# Altium footprint library IC_SMD_BGA.PCBLIB: 70 footprints (part 4 of 6)
Each footprint in its own frame and in the unit in brackets; x right, y up, seen from the top. Pads: shape width x height; smd on the part's side, far side on the other; paste and mask are expansions set on the pad; w line width, h text height; cw(c..) or ccw(c..) is an arc to the next point about the centre after c.
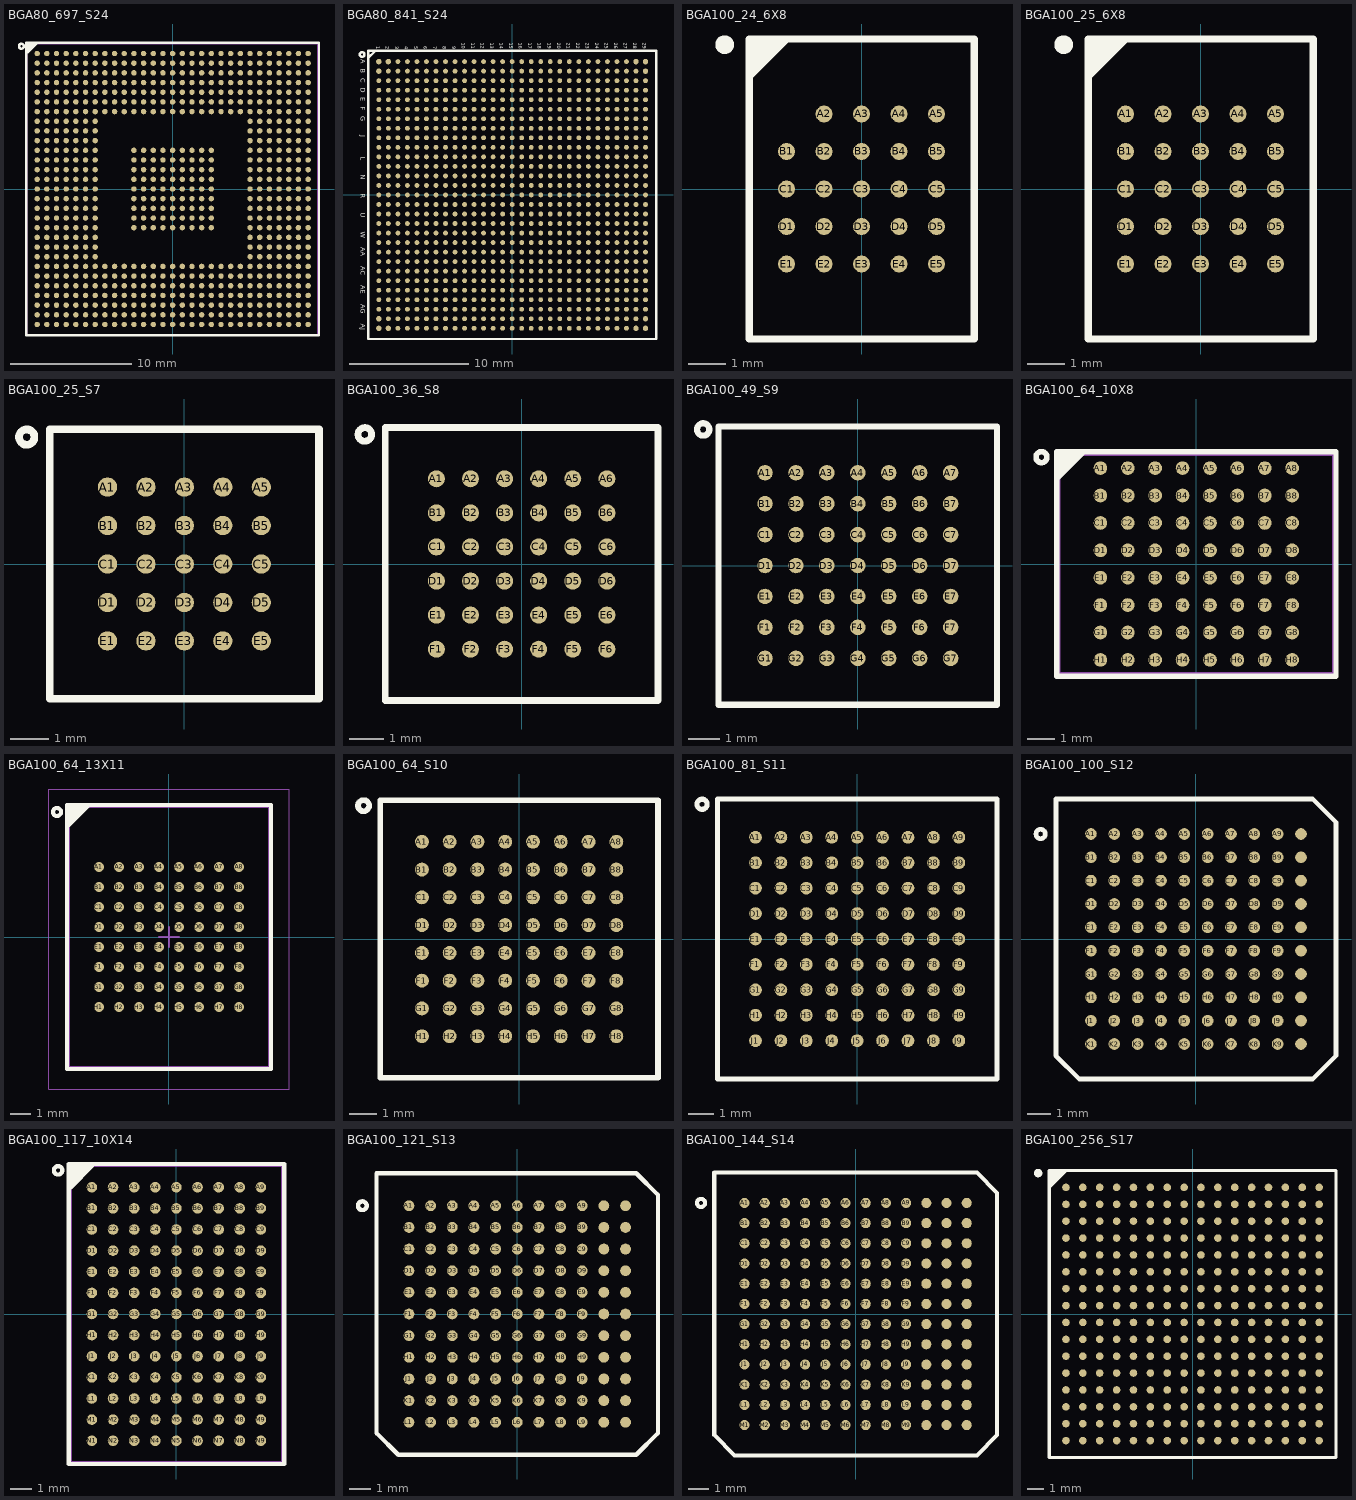
[diagram p3: the footprints below, top view; thin cyan lines are the x and y axes]

## BGA80_697_S24 [mm] "ZTZ GTZ PBGA N697"
height 3.2
pads (697):
  round 0.45 smd: A1(-11.2,11.2) A2(-10.4,11.2) A3(-9.6,11.2) A4(-8.8,11.2) A5(-8,11.2) A6(-7.2,11.2) A7(-6.4,11.2) A8(-5.6,11.2) A9(-4.8,11.2) A10(-4,11.2) A11(-3.2,11.2) A12(-2.4,11.2) A13(-1.6,11.2) A14(-0.8,11.2) A15(0,11.2) A16(0.8,11.2) A17(1.6,11.2) A18(2.4,11.2) A19(3.2,11.2) A20(4,11.2) A21(4.8,11.2) A22(5.6,11.2) A23(6.4,11.2) A24(7.2,11.2) A25(8,11.2) A26(8.8,11.2) A27(9.6,11.2) A28(10.4,11.2) A29(11.2,11.2) AA1(-11.2,-4.8) AA2(-10.4,-4.8) AA3(-9.6,-4.8) AA4(-8.8,-4.8) AA5(-8,-4.8) AA6(-7.2,-4.8) AA7(-6.4,-4.8) AA23(6.4,-4.8) AA24(7.2,-4.8) AA25(8,-4.8) AA26(8.8,-4.8) AA27(9.6,-4.8) AA28(10.4,-4.8) AA29(11.2,-4.8) AB1(-11.2,-5.6) AB2(-10.4,-5.6) AB3(-9.6,-5.6) AB4(-8.8,-5.6) AB5(-8,-5.6) AB6(-7.2,-5.6) AB7(-6.4,-5.6) AB23(6.4,-5.6) AB24(7.2,-5.6) AB25(8,-5.6) AB26(8.8,-5.6) AB27(9.6,-5.6) AB28(10.4,-5.6) AB29(11.2,-5.6) AC1(-11.2,-6.4) AC2(-10.4,-6.4) AC3(-9.6,-6.4) AC4(-8.8,-6.4) AC5(-8,-6.4) AC6(-7.2,-6.4) AC7(-6.4,-6.4) AC8(-5.6,-6.4) AC9(-4.8,-6.4) AC10(-4,-6.4) AC11(-3.2,-6.4) AC12(-2.4,-6.4) AC13(-1.6,-6.4) AC14(-0.8,-6.4) AC15(0,-6.4) AC16(0.8,-6.4) AC17(1.6,-6.4) AC18(2.4,-6.4) AC19(3.2,-6.4) AC20(4,-6.4) AC21(4.8,-6.4) AC22(5.6,-6.4) AC23(6.4,-6.4) AC24(7.2,-6.4) AC25(8,-6.4) AC26(8.8,-6.4) AC27(9.6,-6.4) AC28(10.4,-6.4) AC29(11.2,-6.4) AD1(-11.2,-7.2) AD2(-10.4,-7.2) AD3(-9.6,-7.2) AD4(-8.8,-7.2) AD5(-8,-7.2) AD6(-7.2,-7.2) AD7(-6.4,-7.2) AD8(-5.6,-7.2) AD9(-4.8,-7.2) AD10(-4,-7.2) AD11(-3.2,-7.2) AD12(-2.4,-7.2) AD13(-1.6,-7.2) AD14(-0.8,-7.2) AD15(0,-7.2) AD16(0.8,-7.2) AD17(1.6,-7.2) AD18(2.4,-7.2) AD19(3.2,-7.2) AD20(4,-7.2) AD21(4.8,-7.2) AD22(5.6,-7.2) AD23(6.4,-7.2) AD24(7.2,-7.2) AD25(8,-7.2) AD26(8.8,-7.2) AD27(9.6,-7.2) AD28(10.4,-7.2) AD29(11.2,-7.2) AE1(-11.2,-8) AE2(-10.4,-8) AE3(-9.6,-8) AE4(-8.8,-8) AE5(-8,-8) AE6(-7.2,-8) AE7(-6.4,-8) AE8(-5.6,-8) AE9(-4.8,-8) AE10(-4,-8) AE11(-3.2,-8) AE12(-2.4,-8) AE13(-1.6,-8) AE14(-0.8,-8) AE15(0,-8) AE16(0.8,-8) AE17(1.6,-8) AE18(2.4,-8) AE19(3.2,-8) AE20(4,-8) AE21(4.8,-8) AE22(5.6,-8) AE23(6.4,-8) AE24(7.2,-8) AE25(8,-8) AE26(8.8,-8) AE27(9.6,-8) AE28(10.4,-8) AE29(11.2,-8) AF1(-11.2,-8.8) AF2(-10.4,-8.8) AF3(-9.6,-8.8) AF4(-8.8,-8.8) AF5(-8,-8.8) AF6(-7.2,-8.8) AF7(-6.4,-8.8) AF8(-5.6,-8.8) AF9(-4.8,-8.8) AF10(-4,-8.8) AF11(-3.2,-8.8) AF12(-2.4,-8.8) AF13(-1.6,-8.8) AF14(-0.8,-8.8) AF15(0,-8.8) AF16(0.8,-8.8) AF17(1.6,-8.8) AF18(2.4,-8.8) AF19(3.2,-8.8) AF20(4,-8.8) AF21(4.8,-8.8) AF22(5.6,-8.8) AF23(6.4,-8.8) AF24(7.2,-8.8) AF25(8,-8.8) AF26(8.8,-8.8) AF27(9.6,-8.8) AF28(10.4,-8.8) AF29(11.2,-8.8) AG1(-11.2,-9.6) AG2(-10.4,-9.6) AG3(-9.6,-9.6) AG4(-8.8,-9.6) AG5(-8,-9.6) AG6(-7.2,-9.6) AG7(-6.4,-9.6) AG8(-5.6,-9.6) AG9(-4.8,-9.6) AG10(-4,-9.6) AG11(-3.2,-9.6) AG12(-2.4,-9.6) AG13(-1.6,-9.6) AG14(-0.8,-9.6) AG15(0,-9.6) AG16(0.8,-9.6) AG17(1.6,-9.6) AG18(2.4,-9.6) AG19(3.2,-9.6) AG20(4,-9.6) AG21(4.8,-9.6) AG22(5.6,-9.6) AG23(6.4,-9.6) AG24(7.2,-9.6) AG25(8,-9.6) AG26(8.8,-9.6) AG27(9.6,-9.6) AG28(10.4,-9.6) AG29(11.2,-9.6) AH1(-11.2,-10.4) AH2(-10.4,-10.4) AH3(-9.6,-10.4) AH4(-8.8,-10.4) AH5(-8,-10.4) AH6(-7.2,-10.4) AH7(-6.4,-10.4) AH8(-5.6,-10.4) AH9(-4.8,-10.4) AH10(-4,-10.4) AH11(-3.2,-10.4) AH12(-2.4,-10.4) AH13(-1.6,-10.4) AH14(-0.8,-10.4) AH15(0,-10.4) AH16(0.8,-10.4) AH17(1.6,-10.4) AH18(2.4,-10.4) AH19(3.2,-10.4) AH20(4,-10.4) AH21(4.8,-10.4) AH22(5.6,-10.4) AH23(6.4,-10.4) AH24(7.2,-10.4) AH25(8,-10.4) AH26(8.8,-10.4) AH27(9.6,-10.4) AH28(10.4,-10.4) AH29(11.2,-10.4) AJ1(-11.2,-11.2) AJ2(-10.4,-11.2) AJ3(-9.6,-11.2) AJ4(-8.8,-11.2) AJ5(-8,-11.2) AJ6(-7.2,-11.2) AJ7(-6.4,-11.2) AJ8(-5.6,-11.2) AJ9(-4.8,-11.2) AJ10(-4,-11.2) AJ11(-3.2,-11.2) AJ12(-2.4,-11.2) AJ13(-1.6,-11.2) AJ14(-0.8,-11.2) AJ15(0,-11.2) AJ16(0.8,-11.2) AJ17(1.6,-11.2) AJ18(2.4,-11.2) AJ19(3.2,-11.2) AJ20(4,-11.2) AJ21(4.8,-11.2) AJ22(5.6,-11.2) AJ23(6.4,-11.2) AJ24(7.2,-11.2) AJ25(8,-11.2) AJ26(8.8,-11.2) AJ27(9.6,-11.2) AJ28(10.4,-11.2) AJ29(11.2,-11.2) B1(-11.2,10.4) B2(-10.4,10.4) B3(-9.6,10.4) B4(-8.8,10.4) B5(-8,10.4) B6(-7.2,10.4) B7(-6.4,10.4) B8(-5.6,10.4) B9(-4.8,10.4) B10(-4,10.4) B11(-3.2,10.4) B12(-2.4,10.4) B13(-1.6,10.4) B14(-0.8,10.4) B15(0,10.4) B16(0.8,10.4) B17(1.6,10.4) B18(2.4,10.4) B19(3.2,10.4) B20(4,10.4) B21(4.8,10.4) B22(5.6,10.4) B23(6.4,10.4) B24(7.2,10.4) B25(8,10.4) B26(8.8,10.4) B27(9.6,10.4) B28(10.4,10.4) B29(11.2,10.4) C1(-11.2,9.6) C2(-10.4,9.6) C3(-9.6,9.6) C4(-8.8,9.6) C5(-8,9.6) C6(-7.2,9.6) C7(-6.4,9.6) C8(-5.6,9.6) C9(-4.8,9.6) C10(-4,9.6) C11(-3.2,9.6) C12(-2.4,9.6) C13(-1.6,9.6) C14(-0.8,9.6) C15(0,9.6) C16(0.8,9.6) C17(1.6,9.6) C18(2.4,9.6) C19(3.2,9.6) C20(4,9.6) C21(4.8,9.6) C22(5.6,9.6) C23(6.4,9.6) C24(7.2,9.6) C25(8,9.6) C26(8.8,9.6) C27(9.6,9.6) C28(10.4,9.6) C29(11.2,9.6) D1(-11.2,8.8) D2(-10.4,8.8) D3(-9.6,8.8) D4(-8.8,8.8) D5(-8,8.8) D6(-7.2,8.8) D7(-6.4,8.8) D8(-5.6,8.8) D9(-4.8,8.8) D10(-4,8.8) D11(-3.2,8.8) D12(-2.4,8.8) D13(-1.6,8.8) D14(-0.8,8.8) D15(0,8.8) D16(0.8,8.8) D17(1.6,8.8) D18(2.4,8.8) D19(3.2,8.8) D20(4,8.8) D21(4.8,8.8) D22(5.6,8.8) D23(6.4,8.8) D24(7.2,8.8) D25(8,8.8) D26(8.8,8.8) D27(9.6,8.8) D28(10.4,8.8) D29(11.2,8.8) E1(-11.2,8) E2(-10.4,8) E3(-9.6,8) E4(-8.8,8) E5(-8,8) E6(-7.2,8) E7(-6.4,8) E8(-5.6,8) E9(-4.8,8) E10(-4,8) E11(-3.2,8) E12(-2.4,8) E13(-1.6,8) E14(-0.8,8) E15(0,8) E16(0.8,8) E17(1.6,8) E18(2.4,8) E19(3.2,8) E20(4,8) E21(4.8,8) E22(5.6,8) E23(6.4,8) E24(7.2,8) E25(8,8) E26(8.8,8) E27(9.6,8) E28(10.4,8) E29(11.2,8) F1(-11.2,7.2) F2(-10.4,7.2) F3(-9.6,7.2) F4(-8.8,7.2) F5(-8,7.2) F6(-7.2,7.2) F7(-6.4,7.2) F8(-5.6,7.2) F9(-4.8,7.2) F10(-4,7.2) F11(-3.2,7.2) F12(-2.4,7.2) F13(-1.6,7.2) F14(-0.8,7.2) F15(0,7.2) F16(0.8,7.2) F17(1.6,7.2) F18(2.4,7.2) F19(3.2,7.2) F20(4,7.2) F21(4.8,7.2) F22(5.6,7.2) F23(6.4,7.2) F24(7.2,7.2) F25(8,7.2) F26(8.8,7.2) F27(9.6,7.2) F28(10.4,7.2) F29(11.2,7.2) G1(-11.2,6.4) G2(-10.4,6.4) G3(-9.6,6.4) G4(-8.8,6.4) G5(-8,6.4) G6(-7.2,6.4) G7(-6.4,6.4) G8(-5.6,6.4) G9(-4.8,6.4) G10(-4,6.4) G11(-3.2,6.4) G12(-2.4,6.4) G13(-1.6,6.4) G14(-0.8,6.4) G15(0,6.4) G16(0.8,6.4) G17(1.6,6.4) G18(2.4,6.4) G19(3.2,6.4) G20(4,6.4) G21(4.8,6.4) G22(5.6,6.4) G23(6.4,6.4) G24(7.2,6.4) G25(8,6.4) G26(8.8,6.4) G27(9.6,6.4) G28(10.4,6.4) G29(11.2,6.4) H1(-11.2,5.6) H2(-10.4,5.6) H3(-9.6,5.6) H4(-8.8,5.6) H5(-8,5.6) H6(-7.2,5.6) H7(-6.4,5.6) H23(6.4,5.6) H24(7.2,5.6) H25(8,5.6) H26(8.8,5.6) H27(9.6,5.6) H28(10.4,5.6) H29(11.2,5.6) J1(-11.2,4.8) J2(-10.4,4.8) J3(-9.6,4.8) J4(-8.8,4.8) J5(-8,4.8) J6(-7.2,4.8) J7(-6.4,4.8) J23(6.4,4.8) J24(7.2,4.8) J25(8,4.8) J26(8.8,4.8) J27(9.6,4.8) J28(10.4,4.8) J29(11.2,4.8) K1(-11.2,4) K2(-10.4,4) K3(-9.6,4) K4(-8.8,4) K5(-8,4) K6(-7.2,4) K7(-6.4,4) K23(6.4,4) K24(7.2,4) K25(8,4) K26(8.8,4) K27(9.6,4) K28(10.4,4) K29(11.2,4) L1(-11.2,3.2) L2(-10.4,3.2) L3(-9.6,3.2) L4(-8.8,3.2) L5(-8,3.2) L6(-7.2,3.2) L7(-6.4,3.2) L11(-3.2,3.2) L12(-2.4,3.2) L13(-1.6,3.2) L14(-0.8,3.2) L15(0,3.2) L16(0.8,3.2) L17(1.6,3.2) L18(2.4,3.2) L19(3.2,3.2) L23(6.4,3.2) L24(7.2,3.2) L25(8,3.2) L26(8.8,3.2) L27(9.6,3.2) L28(10.4,3.2) L29(11.2,3.2) M1(-11.2,2.4) M2(-10.4,2.4) M3(-9.6,2.4) M4(-8.8,2.4) M5(-8,2.4) M6(-7.2,2.4) M7(-6.4,2.4) M11(-3.2,2.4) M12(-2.4,2.4) M13(-1.6,2.4) M14(-0.8,2.4) M15(0,2.4) M16(0.8,2.4) M17(1.6,2.4) M18(2.4,2.4) M19(3.2,2.4) M23(6.4,2.4) M24(7.2,2.4) M25(8,2.4) M26(8.8,2.4) M27(9.6,2.4) M28(10.4,2.4) M29(11.2,2.4) N1(-11.2,1.6) N2(-10.4,1.6) N3(-9.6,1.6) N4(-8.8,1.6) N5(-8,1.6) N6(-7.2,1.6) N7(-6.4,1.6) N11(-3.2,1.6) N12(-2.4,1.6) N13(-1.6,1.6) N14(-0.8,1.6) N15(0,1.6) N16(0.8,1.6) N17(1.6,1.6) N18(2.4,1.6) N19(3.2,1.6) N23(6.4,1.6) N24(7.2,1.6) N25(8,1.6) N26(8.8,1.6) N27(9.6,1.6) N28(10.4,1.6) N29(11.2,1.6) P1(-11.2,0.8) P2(-10.4,0.8) P3(-9.6,0.8) P4(-8.8,0.8) P5(-8,0.8) P6(-7.2,0.8) P7(-6.4,0.8) P11(-3.2,0.8) P12(-2.4,0.8) P13(-1.6,0.8) P14(-0.8,0.8) P15(0,0.8) P16(0.8,0.8) P17(1.6,0.8) P18(2.4,0.8) P19(3.2,0.8) P23(6.4,0.8) P24(7.2,0.8) P25(8,0.8) P26(8.8,0.8) P27(9.6,0.8) P28(10.4,0.8) P29(11.2,0.8) R1(-11.2,0) R2(-10.4,0) R3(-9.6,0) R4(-8.8,0) R5(-8,0) R6(-7.2,0) R7(-6.4,0) R11(-3.2,0) R12(-2.4,0) R13(-1.6,0) R14(-0.8,0) R15(0,0) R16(0.8,0) R17(1.6,0) R18(2.4,0) R19(3.2,0) R23(6.4,0) R24(7.2,0) R25(8,0) R26(8.8,0) R27(9.6,0) R28(10.4,0) R29(11.2,0) T1(-11.2,-0.8) T2(-10.4,-0.8) T3(-9.6,-0.8) T4(-8.8,-0.8) T5(-8,-0.8) T6(-7.2,-0.8) T7(-6.4,-0.8) T11(-3.2,-0.8) T12(-2.4,-0.8) T13(-1.6,-0.8) T14(-0.8,-0.8) T15(0,-0.8) T16(0.8,-0.8) T17(1.6,-0.8) T18(2.4,-0.8) T19(3.2,-0.8) T23(6.4,-0.8) T24(7.2,-0.8) T25(8,-0.8) T26(8.8,-0.8) T27(9.6,-0.8) T28(10.4,-0.8) T29(11.2,-0.8) U1(-11.2,-1.6) U2(-10.4,-1.6) U3(-9.6,-1.6) U4(-8.8,-1.6) U5(-8,-1.6) U6(-7.2,-1.6) U7(-6.4,-1.6) U11(-3.2,-1.6) U12(-2.4,-1.6) U13(-1.6,-1.6) U14(-0.8,-1.6) U15(0,-1.6) U16(0.8,-1.6) U17(1.6,-1.6) U18(2.4,-1.6) U19(3.2,-1.6) U23(6.4,-1.6) U24(7.2,-1.6) U25(8,-1.6) U26(8.8,-1.6) U27(9.6,-1.6) U28(10.4,-1.6) U29(11.2,-1.6) V1(-11.2,-2.4) V2(-10.4,-2.4) V3(-9.6,-2.4) V4(-8.8,-2.4) V5(-8,-2.4) V6(-7.2,-2.4) V7(-6.4,-2.4) V11(-3.2,-2.4) V12(-2.4,-2.4) V13(-1.6,-2.4) V14(-0.8,-2.4) V15(0,-2.4) V16(0.8,-2.4) V17(1.6,-2.4) V18(2.4,-2.4) V19(3.2,-2.4) V23(6.4,-2.4) V24(7.2,-2.4) V25(8,-2.4) V26(8.8,-2.4) V27(9.6,-2.4) V28(10.4,-2.4) V29(11.2,-2.4) W1(-11.2,-3.2) W2(-10.4,-3.2) W3(-9.6,-3.2) W4(-8.8,-3.2) W5(-8,-3.2) W6(-7.2,-3.2) W7(-6.4,-3.2) W11(-3.2,-3.2) W12(-2.4,-3.2) W13(-1.6,-3.2) W14(-0.8,-3.2) W15(0,-3.2) W16(0.8,-3.2) W17(1.6,-3.2) W18(2.4,-3.2) W19(3.2,-3.2) W23(6.4,-3.2) W24(7.2,-3.2) W25(8,-3.2) W26(8.8,-3.2) W27(9.6,-3.2) W28(10.4,-3.2) W29(11.2,-3.2) Y1(-11.2,-4) Y2(-10.4,-4) Y3(-9.6,-4) Y4(-8.8,-4) Y5(-8,-4) Y6(-7.2,-4) Y7(-6.4,-4) Y23(6.4,-4) Y24(7.2,-4) Y25(8,-4) Y26(8.8,-4) Y27(9.6,-4) Y28(10.4,-4) Y29(11.2,-4)
TopOverlay:
  circle w0.2: c-12.5,11.8 r0.2
  region: -11.284,12 -12,11.284 -12,12
  lines w0.2: -12,11.284 -11.284,12 ; -12.1,-12.1 -12.1,12.1 12.1,12.1 12.1,-12.1 -12.1,-12.1
Mechanical13:
  lines w0.1: -12,-12 -12,12 12,12 12,-12 -12,-12
3D body: height 3.2, standoff 0.35, extent -12,-12 12,12

## BGA80_841_S24 [mil] "BGA_841P_31_945X945"
pads (841):
  round 18 smd: A1(-440.94,440.94) A2(-409.45,440.94) A28(409.45,440.94) A29(440.94,440.94) AH1(-440.94,-409.45) AH29(440.94,-409.45) AJ1(-440.94,-440.94) AJ2(-409.45,-440.94) AJ28(409.45,-440.94) AJ29(440.94,-440.94) B1(-440.94,409.45) B29(440.94,409.45)
  round 16 smd: A3(-377.95,440.94) A4(-346.46,440.94) A5(-314.96,440.94) A6(-283.46,440.94) A7(-251.97,440.94) A8(-220.47,440.94) A9(-188.98,440.94) A10(-157.48,440.94) A11(-125.98,440.94) A12(-94.49,440.94) A13(-62.99,440.94) A14(-31.5,440.94) A15(0,440.94) A16(31.5,440.94) A17(62.99,440.94) A18(94.49,440.94) A19(125.98,440.94) A20(157.48,440.94) A21(188.98,440.94) A22(220.47,440.94) A23(251.97,440.94) A24(283.46,440.94) A25(314.96,440.94) A26(346.46,440.94) A27(377.95,440.94) AA1(-440.94,-188.98) AA2(-409.45,-188.98) AA3(-377.95,-188.98) AA4(-346.46,-188.98) AA5(-314.96,-188.98) AA6(-283.46,-188.98) AA7(-251.97,-188.98) AA8(-220.47,-188.98) AA9(-188.98,-188.98) AA10(-157.48,-188.98) AA11(-125.98,-188.98) AA12(-94.49,-188.98) AA13(-62.99,-188.98) AA14(-31.5,-188.98) AA15(0,-188.98) AA16(31.5,-188.98) AA17(62.99,-188.98) AA18(94.49,-188.98) AA19(125.98,-188.98) AA20(157.48,-188.98) AA21(188.98,-188.98) AA22(220.47,-188.98) AA23(251.97,-188.98) AA24(283.46,-188.98) AA25(314.96,-188.98) AA26(346.46,-188.98) AA27(377.95,-188.98) AA28(409.45,-188.98) AA29(440.94,-188.98) AB1(-440.94,-220.47) AB2(-409.45,-220.47) AB3(-377.95,-220.47) AB4(-346.46,-220.47) AB5(-314.96,-220.47) AB6(-283.46,-220.47) AB7(-251.97,-220.47) AB8(-220.47,-220.47) AB9(-188.98,-220.47) AB10(-157.48,-220.47) AB11(-125.98,-220.47) AB12(-94.49,-220.47) AB13(-62.99,-220.47) AB14(-31.5,-220.47) AB15(0,-220.47) AB16(31.5,-220.47) AB17(62.99,-220.47) AB18(94.49,-220.47) AB19(125.98,-220.47) AB20(157.48,-220.47) AB21(188.98,-220.47) AB22(220.47,-220.47) AB23(251.97,-220.47) AB24(283.46,-220.47) AB25(314.96,-220.47) AB26(346.46,-220.47) AB27(377.95,-220.47) AB28(409.45,-220.47) AB29(440.94,-220.47) AC1(-440.94,-251.97) AC2(-409.45,-251.97) AC3(-377.95,-251.97) AC4(-346.46,-251.97) AC5(-314.96,-251.97) AC6(-283.46,-251.97) AC7(-251.97,-251.97) AC8(-220.47,-251.97) AC9(-188.98,-251.97) AC10(-157.48,-251.97) AC11(-125.98,-251.97) AC12(-94.49,-251.97) AC13(-62.99,-251.97) AC14(-31.5,-251.97) AC15(0,-251.97) AC16(31.5,-251.97) AC17(62.99,-251.97) AC18(94.49,-251.97) AC19(125.98,-251.97) AC20(157.48,-251.97) AC21(188.98,-251.97) AC22(220.47,-251.97) AC23(251.97,-251.97) AC24(283.46,-251.97) AC25(314.96,-251.97) AC26(346.46,-251.97) AC27(377.95,-251.97) AC28(409.45,-251.97) AC29(440.94,-251.97) AD1(-440.94,-283.46) AD2(-409.45,-283.46) AD3(-377.95,-283.46) AD4(-346.46,-283.46) AD5(-314.96,-283.46) AD6(-283.46,-283.46) AD7(-251.97,-283.46) AD8(-220.47,-283.46) AD9(-188.98,-283.46) AD10(-157.48,-283.46) AD11(-125.98,-283.46) AD12(-94.49,-283.46) AD13(-62.99,-283.46) AD14(-31.5,-283.46) AD15(0,-283.46) AD16(31.5,-283.46) AD17(62.99,-283.46) AD18(94.49,-283.46) AD19(125.98,-283.46) AD20(157.48,-283.46) AD21(188.98,-283.46) AD22(220.47,-283.46) AD23(251.97,-283.46) AD24(283.46,-283.46) AD25(314.96,-283.46) AD26(346.46,-283.46) AD27(377.95,-283.46) AD28(409.45,-283.46) AD29(440.94,-283.46) AE1(-440.94,-314.96) AE2(-409.45,-314.96) AE3(-377.95,-314.96) AE4(-346.46,-314.96) AE5(-314.96,-314.96) AE6(-283.46,-314.96) AE7(-251.97,-314.96) AE8(-220.47,-314.96) AE9(-188.98,-314.96) AE10(-157.48,-314.96) AE11(-125.98,-314.96) AE12(-94.49,-314.96) AE13(-62.99,-314.96) AE14(-31.5,-314.96) AE15(0,-314.96) AE16(31.5,-314.96) AE17(62.99,-314.96) AE18(94.49,-314.96) AE19(125.98,-314.96) AE20(157.48,-314.96) AE21(188.98,-314.96) AE22(220.47,-314.96) AE23(251.97,-314.96) AE24(283.46,-314.96) AE25(314.96,-314.96) AE26(346.46,-314.96) AE27(377.95,-314.96) AE28(409.45,-314.96) AE29(440.94,-314.96) AF1(-440.94,-346.46) AF2(-409.45,-346.46) AF3(-377.95,-346.46) AF4(-346.46,-346.46) AF5(-314.96,-346.46) AF6(-283.46,-346.46) AF7(-251.97,-346.46) AF8(-220.47,-346.46) AF9(-188.98,-346.46) AF10(-157.48,-346.46) AF11(-125.98,-346.46) AF12(-94.49,-346.46) AF13(-62.99,-346.46) AF14(-31.5,-346.46) AF15(0,-346.46) AF16(31.5,-346.46) AF17(62.99,-346.46) AF18(94.49,-346.46) AF19(125.98,-346.46) AF20(157.48,-346.46) AF21(188.98,-346.46) AF22(220.47,-346.46) AF23(251.97,-346.46) AF24(283.46,-346.46) AF25(314.96,-346.46) AF26(346.46,-346.46) AF27(377.95,-346.46) AF28(409.45,-346.46) AF29(440.94,-346.46) AG1(-440.94,-377.95) AG2(-409.45,-377.95) AG3(-377.95,-377.95) AG4(-346.46,-377.95) AG5(-314.96,-377.95) AG6(-283.46,-377.95) AG7(-251.97,-377.95) AG8(-220.47,-377.95) AG9(-188.98,-377.95) AG10(-157.48,-377.95) AG11(-125.98,-377.95) AG12(-94.49,-377.95) AG13(-62.99,-377.95) AG14(-31.5,-377.95) AG15(0,-377.95) AG16(31.5,-377.95) AG17(62.99,-377.95) AG18(94.49,-377.95) AG19(125.98,-377.95) AG20(157.48,-377.95) AG21(188.98,-377.95) AG22(220.47,-377.95) AG23(251.97,-377.95) AG24(283.46,-377.95) AG25(314.96,-377.95) AG26(346.46,-377.95) AG27(377.95,-377.95) AG28(409.45,-377.95) AG29(440.94,-377.95) AH2(-409.45,-409.45) AH3(-377.95,-409.45) AH4(-346.46,-409.45) AH5(-314.96,-409.45) AH6(-283.46,-409.45) AH7(-251.97,-409.45) AH8(-220.47,-409.45) AH9(-188.98,-409.45) AH10(-157.48,-409.45) AH11(-125.98,-409.45) AH12(-94.49,-409.45) AH13(-62.99,-409.45) AH14(-31.5,-409.45) AH15(0,-409.45) AH16(31.5,-409.45) AH17(62.99,-409.45) AH18(94.49,-409.45) AH19(125.98,-409.45) AH20(157.48,-409.45) AH21(188.98,-409.45) AH22(220.47,-409.45) AH23(251.97,-409.45) AH24(283.46,-409.45) AH25(314.96,-409.45) AH26(346.46,-409.45) AH27(377.95,-409.45) AH28(409.45,-409.45) AJ3(-377.95,-440.94) AJ4(-346.46,-440.94) AJ5(-314.96,-440.94) AJ6(-283.46,-440.94) AJ7(-251.97,-440.94) AJ8(-220.47,-440.94) AJ9(-188.98,-440.94) AJ10(-157.48,-440.94) AJ11(-125.98,-440.94) AJ12(-94.49,-440.94) AJ13(-62.99,-440.94) AJ14(-31.5,-440.94) AJ15(0,-440.94) AJ16(31.5,-440.94) AJ17(62.99,-440.94) AJ18(94.49,-440.94) AJ19(125.98,-440.94) AJ20(157.48,-440.94) AJ21(188.98,-440.94) AJ22(220.47,-440.94) AJ23(251.97,-440.94) AJ24(283.46,-440.94) AJ25(314.96,-440.94) AJ26(346.46,-440.94) AJ27(377.95,-440.94) B2(-409.45,409.45) B3(-377.95,409.45) B4(-346.46,409.45) B5(-314.96,409.45) B6(-283.46,409.45) B7(-251.97,409.45) B8(-220.47,409.45) B9(-188.98,409.45) B10(-157.48,409.45) B11(-125.98,409.45) B12(-94.49,409.45) B13(-62.99,409.45) B14(-31.5,409.45) B15(0,409.45) B16(31.5,409.45) B17(62.99,409.45) B18(94.49,409.45) B19(125.98,409.45) B20(157.48,409.45) B21(188.98,409.45) B22(220.47,409.45) B23(251.97,409.45) B24(283.46,409.45) B25(314.96,409.45) B26(346.46,409.45) B27(377.95,409.45) B28(409.45,409.45) C1(-440.94,377.95) C2(-409.45,377.95) C3(-377.95,377.95) C4(-346.46,377.95) C5(-314.96,377.95) C6(-283.46,377.95) C7(-251.97,377.95) C8(-220.47,377.95) C9(-188.98,377.95) C10(-157.48,377.95) C11(-125.98,377.95) C12(-94.49,377.95) C13(-62.99,377.95) C14(-31.5,377.95) C15(0,377.95) C16(31.5,377.95) C17(62.99,377.95) C18(94.49,377.95) C19(125.98,377.95) C20(157.48,377.95) C21(188.98,377.95) C22(220.47,377.95) C23(251.97,377.95) C24(283.46,377.95) C25(314.96,377.95) C26(346.46,377.95) C27(377.95,377.95) C28(409.45,377.95) C29(440.94,377.95) D1(-440.94,346.46) D2(-409.45,346.46) D3(-377.95,346.46) D4(-346.46,346.46) D5(-314.96,346.46) D6(-283.46,346.46) D7(-251.97,346.46) D8(-220.47,346.46) D9(-188.98,346.46) D10(-157.48,346.46) D11(-125.98,346.46) D12(-94.49,346.46) D13(-62.99,346.46) D14(-31.5,346.46) D15(0,346.46) D16(31.5,346.46) D17(62.99,346.46) D18(94.49,346.46) D19(125.98,346.46) D20(157.48,346.46) D21(188.98,346.46) D22(220.47,346.46) D23(251.97,346.46) D24(283.46,346.46) D25(314.96,346.46) D26(346.46,346.46) D27(377.95,346.46) D28(409.45,346.46) D29(440.94,346.46) E1(-440.94,314.96) E2(-409.45,314.96) E3(-377.95,314.96) E4(-346.46,314.96) E5(-314.96,314.96) E6(-283.46,314.96) E7(-251.97,314.96) E8(-220.47,314.96) E9(-188.98,314.96) E10(-157.48,314.96) E11(-125.98,314.96) E12(-94.49,314.96) E13(-62.99,314.96) E14(-31.5,314.96) E15(0,314.96) E16(31.5,314.96) E17(62.99,314.96) E18(94.49,314.96) E19(125.98,314.96) E20(157.48,314.96) E21(188.98,314.96) E22(220.47,314.96) E23(251.97,314.96) E24(283.46,314.96) E25(314.96,314.96) E26(346.46,314.96) E27(377.95,314.96) E28(409.45,314.96) E29(440.94,314.96) F1(-440.94,283.46) F2(-409.45,283.46) F3(-377.95,283.46) F4(-346.46,283.46) F5(-314.96,283.46) F6(-283.46,283.46) F7(-251.97,283.46) F8(-220.47,283.46) F9(-188.98,283.46) F10(-157.48,283.46) F11(-125.98,283.46) F12(-94.49,283.46) F13(-62.99,283.46) F14(-31.5,283.46) F15(0,283.46) F16(31.5,283.46) F17(62.99,283.46) F18(94.49,283.46) F19(125.98,283.46) F20(157.48,283.46) F21(188.98,283.46) F22(220.47,283.46) F23(251.97,283.46) F24(283.46,283.46) F25(314.96,283.46) F26(346.46,283.46) F27(377.95,283.46) F28(409.45,283.46) F29(440.94,283.46) G1(-440.94,251.97) G2(-409.45,251.97) G3(-377.95,251.97) G4(-346.46,251.97) G5(-314.96,251.97) G6(-283.46,251.97) G7(-251.97,251.97) G8(-220.47,251.97) G9(-188.98,251.97) G10(-157.48,251.97) G11(-125.98,251.97) G12(-94.49,251.97) G13(-62.99,251.97) G14(-31.5,251.97) G15(0,251.97) G16(31.5,251.97) G17(62.99,251.97) G18(94.49,251.97) G19(125.98,251.97) G20(157.48,251.97) G21(188.98,251.97) G22(220.47,251.97) G23(251.97,251.97) G24(283.46,251.97) G25(314.96,251.97) G26(346.46,251.97) G27(377.95,251.97) G28(409.45,251.97) G29(440.94,251.97) H1(-440.94,220.47) H2(-409.45,220.47) H3(-377.95,220.47) H4(-346.46,220.47) H5(-314.96,220.47) H6(-283.46,220.47) H7(-251.97,220.47) H8(-220.47,220.47) H9(-188.98,220.47) H10(-157.48,220.47) H11(-125.98,220.47) H12(-94.49,220.47) H13(-62.99,220.47) H14(-31.5,220.47) H15(0,220.47) H16(31.5,220.47) H17(62.99,220.47) H18(94.49,220.47) H19(125.98,220.47) H20(157.48,220.47) H21(188.98,220.47) H22(220.47,220.47) H23(251.97,220.47) H24(283.46,220.47) H25(314.96,220.47) H26(346.46,220.47) H27(377.95,220.47) H28(409.45,220.47) H29(440.94,220.47) J1(-440.94,188.98) J2(-409.45,188.98) J3(-377.95,188.98) J4(-346.46,188.98) J5(-314.96,188.98) J6(-283.46,188.98) J7(-251.97,188.98) J8(-220.47,188.98) J9(-188.98,188.98) J10(-157.48,188.98) J11(-125.98,188.98) J12(-94.49,188.98) J13(-62.99,188.98) J14(-31.5,188.98) J15(0,188.98) J16(31.5,188.98) J17(62.99,188.98) J18(94.49,188.98) J19(125.98,188.98) J20(157.48,188.98) J21(188.98,188.98) J22(220.47,188.98) J23(251.97,188.98) J24(283.46,188.98) J25(314.96,188.98) J26(346.46,188.98) J27(377.95,188.98) J28(409.45,188.98) J29(440.94,188.98) K1(-440.94,157.48) K2(-409.45,157.48) K3(-377.95,157.48) K4(-346.46,157.48) K5(-314.96,157.48) K6(-283.46,157.48) K7(-251.97,157.48) K8(-220.47,157.48) K9(-188.98,157.48) K10(-157.48,157.48) K11(-125.98,157.48) K12(-94.49,157.48) K13(-62.99,157.48) K14(-31.5,157.48) K15(0,157.48) K16(31.5,157.48) K17(62.99,157.48) K18(94.49,157.48) K19(125.98,157.48) K20(157.48,157.48) K21(188.98,157.48) K22(220.47,157.48) K23(251.97,157.48) K24(283.46,157.48) K25(314.96,157.48) K26(346.46,157.48) K27(377.95,157.48) K28(409.45,157.48) K29(440.94,157.48) L1(-440.94,125.98) L2(-409.45,125.98) L3(-377.95,125.98) L4(-346.46,125.98) L5(-314.96,125.98) L6(-283.46,125.98) L7(-251.97,125.98) L8(-220.47,125.98) L9(-188.98,125.98) L10(-157.48,125.98) L11(-125.98,125.98) L12(-94.49,125.98) L13(-62.99,125.98) L14(-31.5,125.98) L15(0,125.98) L16(31.5,125.98) L17(62.99,125.98) L18(94.49,125.98) L19(125.98,125.98) L20(157.48,125.98) L21(188.98,125.98) L22(220.47,125.98) L23(251.97,125.98) L24(283.46,125.98) L25(314.96,125.98) L26(346.46,125.98) L27(377.95,125.98) L28(409.45,125.98) L29(440.94,125.98) M1(-440.94,94.49) M2(-409.45,94.49) M3(-377.95,94.49) M4(-346.46,94.49) M5(-314.96,94.49) M6(-283.46,94.49) M7(-251.97,94.49) M8(-220.47,94.49) M9(-188.98,94.49) M10(-157.48,94.49) M11(-125.98,94.49) M12(-94.49,94.49) M13(-62.99,94.49) M14(-31.5,94.49) M15(0,94.49) M16(31.5,94.49) M17(62.99,94.49) M18(94.49,94.49) M19(125.98,94.49) M20(157.48,94.49) M21(188.98,94.49) M22(220.47,94.49) M23(251.97,94.49) M24(283.46,94.49) M25(314.96,94.49) M26(346.46,94.49) M27(377.95,94.49) M28(409.45,94.49) M29(440.94,94.49) N1(-440.94,62.99) N2(-409.45,62.99) N3(-377.95,62.99) N4(-346.46,62.99) N5(-314.96,62.99) N6(-283.46,62.99) N7(-251.97,62.99) N8(-220.47,62.99) N9(-188.98,62.99) N10(-157.48,62.99) N11(-125.98,62.99) N12(-94.49,62.99) N13(-62.99,62.99) N14(-31.5,62.99) N15(0,62.99) N16(31.5,62.99) N17(62.99,62.99) N18(94.49,62.99) N19(125.98,62.99) N20(157.48,62.99) N21(188.98,62.99) N22(220.47,62.99) N23(251.97,62.99) N24(283.46,62.99) N25(314.96,62.99) N26(346.46,62.99) N27(377.95,62.99) N28(409.45,62.99) N29(440.94,62.99) P1(-440.94,31.5) P2(-409.45,31.5) P3(-377.95,31.5) P4(-346.46,31.5) P5(-314.96,31.5) P6(-283.46,31.5) P7(-251.97,31.5) P8(-220.47,31.5) P9(-188.98,31.5) P10(-157.48,31.5) P11(-125.98,31.5) P12(-94.49,31.5) P13(-62.99,31.5) P14(-31.5,31.5) P15(0,31.5) P16(31.5,31.5) P17(62.99,31.5) P18(94.49,31.5) P19(125.98,31.5) P20(157.48,31.5) P21(188.98,31.5) P22(220.47,31.5) P23(251.97,31.5) P24(283.46,31.5) P25(314.96,31.5) P26(346.46,31.5) P27(377.95,31.5) P28(409.45,31.5) P29(440.94,31.5) R1(-440.94,0) R2(-409.45,0) R3(-377.95,0) R4(-346.46,0) R5(-314.96,0) R6(-283.46,0) R7(-251.97,0) R8(-220.47,0) R9(-188.98,0) R10(-157.48,0) R11(-125.98,0) R12(-94.49,0) R13(-62.99,0) R14(-31.5,0) R15(0,0) R16(31.5,0) R17(62.99,0) R18(94.49,0) R19(125.98,0) R20(157.48,0) R21(188.98,0) R22(220.47,0) R23(251.97,0) R24(283.46,0) R25(314.96,0) R26(346.46,0) R27(377.95,0) R28(409.45,0) R29(440.94,0) T1(-440.94,-31.5) T2(-409.45,-31.5) T3(-377.95,-31.5) T4(-346.46,-31.5) T5(-314.96,-31.5) T6(-283.46,-31.5) T7(-251.97,-31.5) T8(-220.47,-31.5) T9(-188.98,-31.5) T10(-157.48,-31.5) T11(-125.98,-31.5) T12(-94.49,-31.5) T13(-62.99,-31.5) T14(-31.5,-31.5) T15(0,-31.5) T16(31.5,-31.5) T17(62.99,-31.5) T18(94.49,-31.5) T19(125.98,-31.5) T20(157.48,-31.5) T21(188.98,-31.5) T22(220.47,-31.5) T23(251.97,-31.5) T24(283.46,-31.5) T25(314.96,-31.5) T26(346.46,-31.5) T27(377.95,-31.5) T28(409.45,-31.5) T29(440.94,-31.5) U1(-440.94,-62.99) U2(-409.45,-62.99) U3(-377.95,-62.99) U4(-346.46,-62.99) U5(-314.96,-62.99) U6(-283.46,-62.99) U7(-251.97,-62.99) U8(-220.47,-62.99) U9(-188.98,-62.99) U10(-157.48,-62.99) U11(-125.98,-62.99) U12(-94.49,-62.99) U13(-62.99,-62.99) U14(-31.5,-62.99) U15(0,-62.99) U16(31.5,-62.99) U17(62.99,-62.99) U18(94.49,-62.99) U19(125.98,-62.99) U20(157.48,-62.99) U21(188.98,-62.99) U22(220.47,-62.99) U23(251.97,-62.99) U24(283.46,-62.99) U25(314.96,-62.99) U26(346.46,-62.99) U27(377.95,-62.99) U28(409.45,-62.99) U29(440.94,-62.99) V1(-440.94,-94.49) V2(-409.45,-94.49) V3(-377.95,-94.49) V4(-346.46,-94.49) V5(-314.96,-94.49) V6(-283.46,-94.49) V7(-251.97,-94.49) V8(-220.47,-94.49) V9(-188.98,-94.49) V10(-157.48,-94.49) V11(-125.98,-94.49) V12(-94.49,-94.49) V13(-62.99,-94.49) V14(-31.5,-94.49) V15(0,-94.49) V16(31.5,-94.49) V17(62.99,-94.49) V18(94.49,-94.49) V19(125.98,-94.49) V20(157.48,-94.49) V21(188.98,-94.49) V22(220.47,-94.49) V23(251.97,-94.49) V24(283.46,-94.49) V25(314.96,-94.49) V26(346.46,-94.49) V27(377.95,-94.49) V28(409.45,-94.49) V29(440.94,-94.49) W1(-440.94,-125.98) W2(-409.45,-125.98) W3(-377.95,-125.98) W4(-346.46,-125.98) W5(-314.96,-125.98) W6(-283.46,-125.98) W7(-251.97,-125.98) W8(-220.47,-125.98) W9(-188.98,-125.98) W10(-157.48,-125.98) W11(-125.98,-125.98) W12(-94.49,-125.98) W13(-62.99,-125.98) W14(-31.5,-125.98) W15(0,-125.98) W16(31.5,-125.98) W17(62.99,-125.98) W18(94.49,-125.98) W19(125.98,-125.98) W20(157.48,-125.98) W21(188.98,-125.98) W22(220.47,-125.98) W23(251.97,-125.98) W24(283.46,-125.98) W25(314.96,-125.98) W26(346.46,-125.98) W27(377.95,-125.98) W28(409.45,-125.98) W29(440.94,-125.98) Y1(-440.94,-157.48) Y2(-409.45,-157.48) Y3(-377.95,-157.48) Y4(-346.46,-157.48) Y5(-314.96,-157.48) Y6(-283.46,-157.48) Y7(-251.97,-157.48) Y8(-220.47,-157.48) Y9(-188.98,-157.48) Y10(-157.48,-157.48) Y11(-125.98,-157.48) Y12(-94.49,-157.48) Y13(-62.99,-157.48) Y14(-31.5,-157.48) Y15(0,-157.48) Y16(31.5,-157.48) Y17(62.99,-157.48) Y18(94.49,-157.48) Y19(125.98,-157.48) Y20(157.48,-157.48) Y21(188.98,-157.48) Y22(220.47,-157.48) Y23(251.97,-157.48) Y24(283.46,-157.48) Y25(314.96,-157.48) Y26(346.46,-157.48) Y27(377.95,-157.48) Y28(409.45,-157.48) Y29(440.94,-157.48)